# Altium integrated library Supp-Lib.IntLib: 86 symbols
Pins are listed as number, name and electrical type; pins without a type are passive.

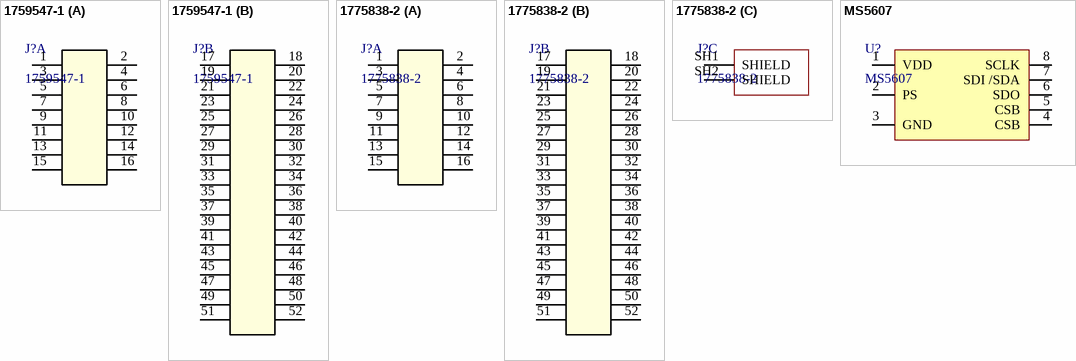
[diagram p0: symbols 1759547-1 to MS5607]

## 1759547-1
designator J?
Mini PCI Express, Mini PCI Express & mSATA, Board-to-Board, 52 Position, .031 in [.8 mm] Centerline, Stack Height 7 mm [.276 in], Gold Flash, Matte; Mfr_Name: TE Connectivity; Copyright: Copyright (C) 2022 Ultra Librarian. All rights reserved.; Manufacturer_Part_Number: 1759547-1; RefDes: RefDes; Type: DEV; ComponentLink1Description: Darasheet; ComponentLink1URL: https://www.te.com.cn/commerce/DocumentDelivery/DDEController?Action=showdoc&DocId=Customer+Drawing%7F1759547%7FJ%7Fpdf%7FEnglish%7FENG_CD_1759547_J.pdf%7F1759547-1; Supplier 1: Arrow Electronics; Supplier Part Number 1: 1759547-1
footprint CONN52_1759547-1_TEC
part A pins: 1, 2, 3, 4, 5, 6, 7, 8, 9, 10, 11, 12, 13, 14, 15, 16
part B pins: 17, 18, 19, 20, 21, 22, 23, 24, 25, 26, 27, 28, 29, 30, 31, 32, 33, 34, 35, 36, 37, 38, 39, 40, 41, 42, 43, 44, 45, 46, 47, 48, 49, 50, 51, 52

## 1775838-2
designator J?
Conn Mini PCI Express Card Edge SKT 52 POS Solder RA SMD T/R; Product_Type: Connector; Centerline_Pitch: .8 mm[.031 in]; MF: TE Connectivity; Number_of_Positions: 52; Availability: Unavailable; MP: 1775838-2; Value: *; Package: None; SnapEDA_Link: https://www.snapeda.com/parts/1775838-2/TE%20Connectivity%20AMP%20Connectors/view-part/804031/?ref=snap; TE_purchase_URL: https://www.te.com/usa-en/product-1775838-2.html?te_bu=Cor&te_type=disp&te_campaign=seda_glo_cor-seda-global-disp-prtnr-fy19-seda-model-bom-cta_sma-317_1&elqCampaignId=32493; EU_RoHS_Compliance: Compliant; Price: None
footprint 17758382
part A pins: 1, 2, 3, 4, 5, 6, 7, 8, 9, 10, 11, 12, 13, 14, 15, 16
part B pins: 17, 18, 19, 20, 21, 22, 23, 24, 25, 26, 27, 28, 29, 30, 31, 32, 33, 34, 35, 36, 37, 38, 39, 40, 41, 42, 43, 44, 45, 46, 47, 48, 49, 50, 51, 52
part C pins: SH1 SHIELD, SH2 SHIELD

## MS5607
designator U?
Barometric Pressure Sensor, with stainless steel cap; ComponentLink1Description: Darasheet; ComponentLink1URL: https://www.te.com.cn/commerce/DocumentDelivery/DDEController?Action=showdoc&DocId=Data+Sheet%7FMS5607-02BA03%7FB3%7Fpdf%7FEnglish%7FENG_DS_MS5607-02BA03_B3.pdf%7FMS560702BA03-50
footprint MS5607
pins: 1 VDD, 2 PS, 3 GND, 4 CSB, 5 CSB, 6 SDO, 7 SDI /SDA, 8 SCLK


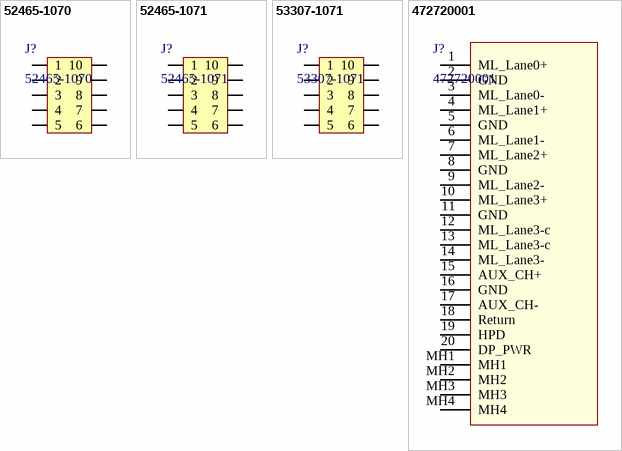
[diagram p1: symbols 52465-1070 to 472720001]

## 52465-1070
designator J?
SlimStack板对板连接器， / 0.80毫米端子间距，浮动接点系列
footprint 52465-1070
pins: 1, 2, 3, 4, 5, 6, 7, 8, 9, 10

## 52465-1071
designator J?
SlimStack板对板连接器， / 0.80毫米端子间距，浮动接点系列
footprint 52465-1071
pins: 1, 2, 3, 4, 5, 6, 7, 8, 9, 10

## 53307-1071
designator J?
SlimStack板对板连接器， / 0.80毫米端子间距，浮动接点系列
footprint 53307-1071
pins: 1, 2, 3, 4, 5, 6, 7, 8, 9, 10

## 472720001
designator J?
Connector; Manufacturer_Name: Molex; Datasheet Link: https://www.arrow.com/en/products/472720001/molex; Height: 6.9mm; Manufacturer_Part_Number: 472720001; Arrow Part Number: 472720001; Arrow Price/Stock: https://www.arrow.com/en/products/472720001/molex
footprint 472720001
pins: 1 ML_Lane0+, 2 GND, 3 ML_Lane0-, 4 ML_Lane1+, 5 GND, 6 ML_Lane1-, 7 ML_Lane2+, 8 GND, 9 ML_Lane2-, 10 ML_Lane3+, 11 GND, 12 ML_Lane3-c, 13 ML_Lane3-c, 14 ML_Lane3-, 15 AUX_CH+, 16 GND, 17 AUX_CH-, 18 Return, 19 HPD, 20 DP_PWR, MH1, MH2, MH3, MH4


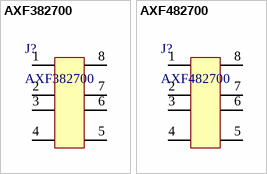
[diagram p2: symbols AXF382700 to AXF482700]

## AXF382700
designator J?
松下连接器 0.7高度8PIN 5A/0.3A
footprint AXF382700
pins: 1, 2, 3, 4, 5, 6, 7, 8

## AXF482700
designator J?
松下连接器 0.7高度8PIN 5A/0.3A
footprint AXF482700
pins: 1, 2, 3, 4, 5, 6, 7, 8


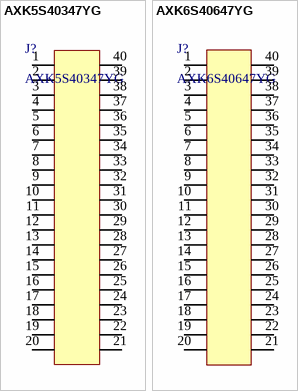
[diagram p3: symbols AXK5S40347YG to AXK6S40647YG]

## AXK5S40347YG
designator J?
P5KS(0.5mm间距)板对板连接器  组合高度（7.0/8.0/9.0）
footprint AXK5S40347YG
pins: 1, 2, 3, 4, 5, 6, 7, 8, 9, 10, 11, 12, 13, 14, 15, 16, 17, 18, 19, 20, 21, 22, 23, 24, 25, 26, 27, 28, 29, 30, 31, 32, 33, 34, 35, 36, 37, 38, 39, 40

## AXK6S40647YG
designator J?
P5KS(0.5mm间距)板对板连接器  组合高度（6.0/6.5/9.0）
footprint AXK6S40647YG
pins: 1, 2, 3, 4, 5, 6, 7, 8, 9, 10, 11, 12, 13, 14, 15, 16, 17, 18, 19, 20, 21, 22, 23, 24, 25, 26, 27, 28, 29, 30, 31, 32, 33, 34, 35, 36, 37, 38, 39, 40


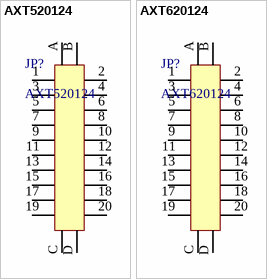
[diagram p4: symbols AXT520124 to AXT620124]

## AXT520124
designator JP?
窄间距连接器F4S(0.4mm间距)母座
footprint AXT520124 (20-PIN 插座)
pins: 1, 2, 3, 4, 5, 6, 7, 8, 9, 10, 11, 12, 13, 14, 15, 16, 17, 18, 19, 20, A, B, C, D

## AXT620124
designator JP?
窄间距连接器F4S(0.4mm间距)公头
footprint AXT620124 (20-PIN 插座)
pins: 1, 2, 3, 4, 5, 6, 7, 8, 9, 10, 11, 12, 13, 14, 15, 16, 17, 18, 19, 20, A, B, C, D


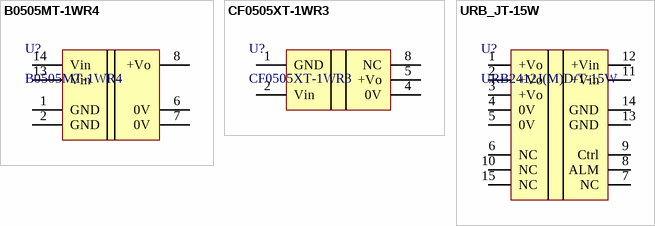
[diagram p5: symbols B0505MT-1WR4 to URB_JT-15W]

## B0505MT-1WR4
designator U?
1W，定电压输入，隔离非稳压单路输出; Revised By: *; ComponentLink1Description: Datasheet; ComponentLink1URL: https://www.mornsun.cn/html/pdf/B0505MT-1WR4.html
footprint B-MT-1WR4
pins: 1 GND, 2 GND, 6 0V, 7 0V, 8 +Vo, 13 Vin, 14 Vin

## CF0505XT-1WR3
designator U?
1W，定电压输入，隔离非稳压单路输出; Revised By: Z_xiao; ComponentLink1Description: Datasheet; ComponentLink1URL: https://www.mornsun.cn/html/pdf/CF0505XT-1WR3.html
footprint F0505XT-W2R3
pins: 1 GND, 2 Vin, 4 0V, 5 +Vo, 8 NC

## URB_JT-15W
designator U?, comment URB2412J(M)D/T-15W
15W，超宽电压输入，隔离稳压单路输出 / DIP/SMD 封装，DC-DC 模块电源
footprint URB_JT-15W
footprint URB_JT-15W - bottom
pins: 1 +Vo, 2 +Vo, 3 +Vo, 4 0V, 5 0V (oe), 6 NC (oe), 7 NC (oe), 8 ALM, 9 Ctrl (oe), 10 NC (oe), 11 +Vin, 12 +Vin, 13 GND, 14 GND, 15 NC (oe)


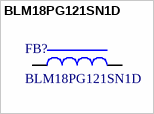
[diagram p6: symbol BLM18PG121SN1D]

## BLM18PG121SN1D
designator FB?
EMIFIL (Inductor type) Chip Ferrite Bead / BLM18P Series (0603 Size); Mfr_Name: Murata; Type: DEV; Impedance: 120ohm@100MHz; Rated Current: 2A; Copyright: Copyright (C) 2022 Ultra Librarian. All rights reserved.; Manufacturer_Part_Number: BLM18PG121SN1D; RefDes: RefDes
footprint IND_BLM18_0603_MUR
footprint IND_BLM18_0603_MUR-L
footprint IND_BLM18_0603_MUR-M
pins: 1, 2


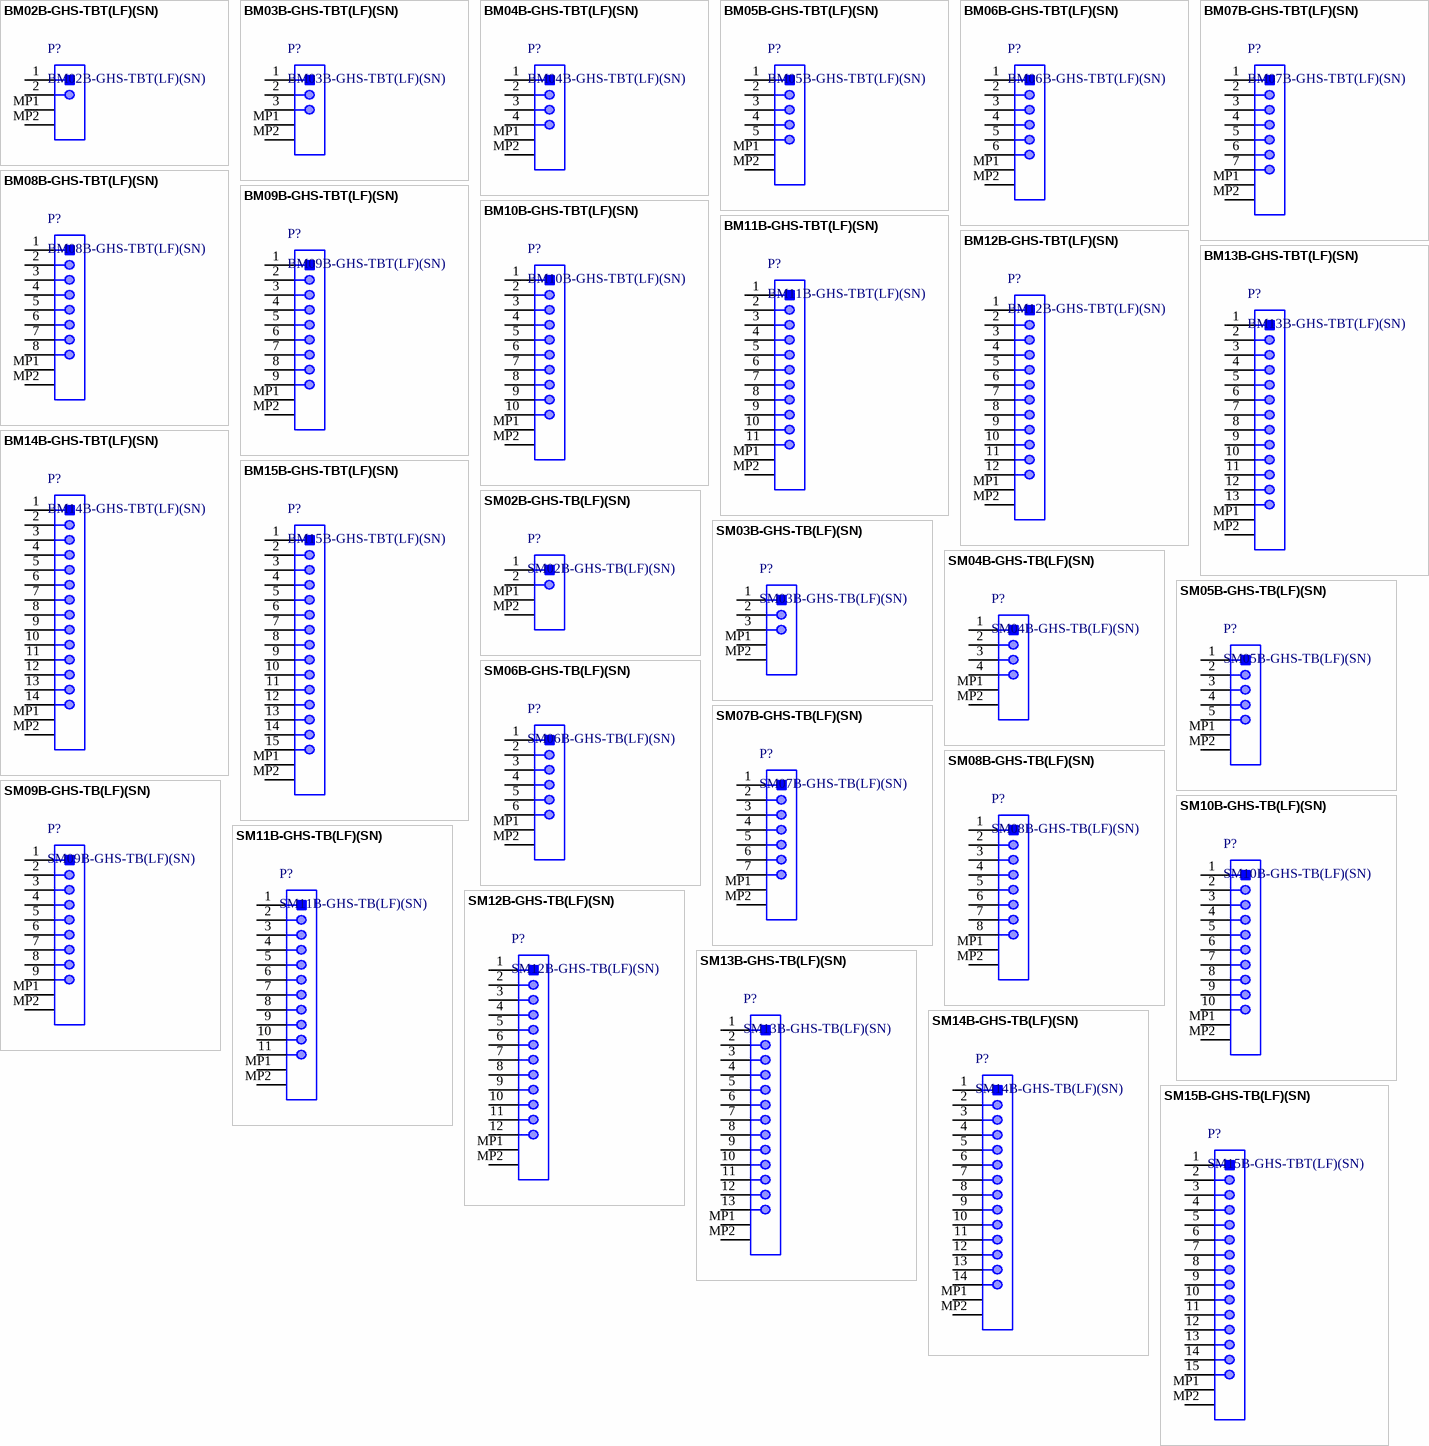
[diagram p7: symbols BM02B-GHS-TBT(LF)(SN) to SM15B-GHS-TB(LF)(SN)]

## BM02B-GHS-TBT(LF)(SN)
designator P?
GH Disconnectable Crimp Style Connector, Pitch 1.25 mm, 1 x 2 Position, Height 4.05 mm, -25 to 85 degC, RoHS, Tape and Reel; Manufacturer: JST; No of Positions: 2; Pitch: 1.25mm; Style/Orientation: StraightHeader/Plug; Package Reference: BM02B-GHS-TBT; Type: WiretoBoard; Datasheet URL: http://www.jst-mfg.com/product/pdf/eng/eGH.pdf; Termination: Crimp; Manufacturer URL: http://www.jst.com/home2.html; Mounting Technology: SurfaceMount; Datasheet Version: 05/2016; Package Description: GH Disconnectable Crimp Style Connector, Pitch 1.25 mm, 1 x 2 Position, Height 4.05 mm
footprint JST-BM02B-GHS-TBT_V (Connector, 2-Leads, Body 5.75x4.25mm, Pitch 1.25mm)
pins: 1, 2, MP1, MP2

## BM03B-GHS-TBT(LF)(SN)
designator P?
GH Disconnectable Crimp Style Connector, Pitch 1.25 mm, 1 x 3 Position, Height 4.05 mm, -25 to 85 degC, RoHS, Tape and Reel; Manufacturer: JST; No of Positions: 3; Pitch: 1.25mm; Style/Orientation: StraightHeader/Plug; Package Reference: BM03B-GHS-TBT; Type: WiretoBoard; Datasheet URL: http://www.jst-mfg.com/product/pdf/eng/eGH.pdf; Termination: Crimp; Manufacturer URL: http://www.jst.com/home2.html; Mounting Technology: SurfaceMount; Datasheet Version: 05/2016; Package Description: GH Disconnectable Crimp Style Connector, Pitch 1.25 mm, 1 x 3 Position, Height 4.05 mm
footprint JST-BM03B-GHS-TBT_V (Connector, 3-Leads, Body 7.00x4.25mm, Pitch 1.25mm)
pins: 1, 2, 3, MP1, MP2

## BM04B-GHS-TBT(LF)(SN)
designator P?
GH Disconnectable Crimp Style Connector, Pitch 1.25 mm, 1 x 4 Position, Height 4.05 mm, -25 to 85 degC, RoHS, Tape and Reel; Manufacturer: JST; No of Positions: 4; Pitch: 1.25mm; Style/Orientation: StraightHeader/Plug; Package Reference: BM04B-GHS-TBT; Type: WiretoBoard; Datasheet URL: http://www.jst-mfg.com/product/pdf/eng/eGH.pdf; Termination: Crimp; Manufacturer URL: http://www.jst.com/home2.html; Mounting Technology: SurfaceMount; Datasheet Version: 05/2016; Package Description: GH Disconnectable Crimp Style Connector, Pitch 1.25 mm, 1 x 4 Position, Height 4.05 mm
footprint JST-BM04B-GHS-TBT_V (Connector, 4-Leads, Body 8.25x4.25mm, Pitch 1.25mm)
pins: 1, 2, 3, 4, MP1, MP2

## BM05B-GHS-TBT(LF)(SN)
designator P?
GH Disconnectable Crimp Style Connector, Pitch 1.25 mm, 1 x 5 Position, Height 4.05 mm, -25 to 85 degC, RoHS, Tape and Reel; Manufacturer: JST; No of Positions: 5; Pitch: 1.25mm; Style/Orientation: StraightHeader/Plug; Package Reference: BM05B-GHS-TBT; Type: WiretoBoard; Datasheet URL: http://www.jst-mfg.com/product/pdf/eng/eGH.pdf; Termination: Crimp; Manufacturer URL: http://www.jst.com/home2.html; Mounting Technology: SurfaceMount; Datasheet Version: 05/2016; Package Description: GH Disconnectable Crimp Style Connector, Pitch 1.25 mm, 1 x 5 Position, Height 4.05 mm
footprint JST-BM05B-GHS-TBT_V (Connector, 5-Leads, Body 9.5x4.25mm, Pitch 1.25mm)
pins: 1, 2, 3, 4, 5, MP1, MP2

## BM06B-GHS-TBT(LF)(SN)
designator P?
GH Disconnectable Crimp Style Connector, Pitch 1.25 mm, 1 x 6 Position, Height 4.05 mm, -25 to 85 degC, RoHS, Tape and Reel; Manufacturer: JST; No of Positions: 6; Pitch: 1.25mm; Style/Orientation: StraightHeader/Plug; Package Reference: BM06B-GHS-TBT; Type: WiretoBoard; Datasheet URL: http://www.jst-mfg.com/product/pdf/eng/eGH.pdf; Termination: Crimp; Manufacturer URL: http://www.jst.com/home2.html; Mounting Technology: SurfaceMount; Datasheet Version: 05/2016; Package Description: GH Disconnectable Crimp Style Connector, Pitch 1.25 mm, 1 x 6 Position, Height 4.05 mm
footprint JST-BM06B-GHS-TBT_V (Connector, 6-Leads, Body 10.75x4.25mm, Pitch 1.25mm)
pins: 1, 2, 3, 4, 5, 6, MP1, MP2

## BM07B-GHS-TBT(LF)(SN)
designator P?
GH Disconnectable Crimp Style Connector, Pitch 1.25 mm, 1 x 7 Position, Height 4.05 mm, -25 to 85 degC, RoHS, Tape and Reel; Manufacturer: JST; No of Positions: 7; Pitch: 1.25mm; Style/Orientation: StraightHeader/Plug; Package Reference: BM07B-GHS-TBT; Type: WiretoBoard; Datasheet URL: http://www.jst-mfg.com/product/pdf/eng/eGH.pdf; Termination: Crimp; Manufacturer URL: http://www.jst.com/home2.html; Mounting Technology: SurfaceMount; Datasheet Version: 05/2016; Package Description: GH Disconnectable Crimp Style Connector, Pitch 1.25 mm, 1 x 7 Position, Height 4.05 mm
footprint JST-BM07B-GHS-TBT_V (Connector, 7-Leads, Body 12.00x4.25mm, Pitch 1.25mm)
pins: 1, 2, 3, 4, 5, 6, 7, MP1, MP2

## BM08B-GHS-TBT(LF)(SN)
designator P?
GH Disconnectable Crimp Style Connector, Pitch 1.25 mm, 1 x 8 Position, Height 4.05 mm, -25 to 85 degC, RoHS, Tape and Reel; Manufacturer: JST; No of Positions: 8; Pitch: 1.25mm; Style/Orientation: StraightHeader/Plug; Package Reference: BM08B-GHS-TBT; Type: WiretoBoard; Datasheet URL: http://www.jst-mfg.com/product/pdf/eng/eGH.pdf; Termination: Crimp; Manufacturer URL: http://www.jst.com/home2.html; Mounting Technology: SurfaceMount; Datasheet Version: 05/2016; Package Description: GH Disconnectable Crimp Style Connector, Pitch 1.25 mm, 1 x 8 Position, Height 4.05 mm
footprint JST-BM08B-GHS-TBT_V (Connector, 8-Leads, Body 13.25x4.25mm, Pitch 1.25mm)
pins: 1, 2, 3, 4, 5, 6, 7, 8, MP1, MP2

## BM09B-GHS-TBT(LF)(SN)
designator P?
GH Disconnectable Crimp Style Connector, Pitch 1.25 mm, 1 x 9 Position, Height 4.05 mm, -25 to 85 degC, RoHS, Tape and Reel; Manufacturer: JST; No of Positions: 9; Pitch: 1.25mm; Style/Orientation: StraightHeader/Plug; Package Reference: BM09B-GHS-TBT; Type: WiretoBoard; Datasheet URL: http://www.jst-mfg.com/product/pdf/eng/eGH.pdf; Termination: Crimp; Manufacturer URL: http://www.jst.com/home2.html; Mounting Technology: SurfaceMount; Datasheet Version: 05/2016; Package Description: GH Disconnectable Crimp Style Connector, Pitch 1.25 mm, 1 x 9 Position, Height 4.05 mm
footprint JST-BM09B-GHS-TBT_V (Connector, 9-Leads, Body  14.50x4.25mm, Pitch 1.25mm)
pins: 1, 2, 3, 4, 5, 6, 7, 8, 9, MP1, MP2

## BM10B-GHS-TBT(LF)(SN)
designator P?
GH Disconnectable Crimp Style Connector, Pitch 1.25 mm, 1 x 10 Position, Height 4.05 mm, -25 to 85 degC, RoHS, Tape and Reel; Manufacturer: JST; No of Positions: 10; Pitch: 1.25mm; Style/Orientation: StraightHeader/Plug; Package Reference: BM10B-GHS-TBT; Type: WiretoBoard; Datasheet URL: http://www.jst-mfg.com/product/pdf/eng/eGH.pdf; Termination: Crimp; Manufacturer URL: http://www.jst.com/home2.html; Mounting Technology: SurfaceMount; Datasheet Version: 05/2016; Package Description: GH Disconnectable Crimp Style Connector, Pitch 1.25 mm, 1 x 10 Position, Height 4.05 mm
footprint JST-BM10B-GHS-TBT_V (Connector, 10-Leads, Body  15.75x4.25mm, Pitch 1.25mm)
pins: 1, 2, 3, 4, 5, 6, 7, 8, 9, 10, MP1, MP2

## BM11B-GHS-TBT(LF)(SN)
designator P?
GH Disconnectable Crimp Style Connector, Pitch 1.25 mm, 1 x 11 Position, Height 4.05 mm, -25 to 85 degC, RoHS, Tape and Reel; Manufacturer: JST; No of Positions: 11; Pitch: 1.25mm; Style/Orientation: StraightHeader/Plug; Package Reference: BM11B-GHS-TBT; Type: WiretoBoard; Datasheet URL: http://www.jst-mfg.com/product/pdf/eng/eGH.pdf; Termination: Crimp; Manufacturer URL: http://www.jst.com/home2.html; Mounting Technology: SurfaceMount; Datasheet Version: 05/2016; Package Description: GH Disconnectable Crimp Style Connector, Pitch 1.25 mm, 1 x 11 Position, Height 4.05 mm
footprint JST-BM11B-GHS-TBT_V (Connector, 11-Leads, Body  17.00x4.25mm, Pitch 1.25mm)
pins: 1, 2, 3, 4, 5, 6, 7, 8, 9, 10, 11, MP1, MP2

## BM12B-GHS-TBT(LF)(SN)
designator P?
GH Disconnectable Crimp Style Connector, Pitch 1.25 mm, 1 x 12 Position, Height 4.05 mm, -25 to 85 degC, RoHS, Tape and Reel; Manufacturer: JST; No of Positions: 12; Pitch: 1.25mm; Style/Orientation: StraightHeader/Plug; Package Reference: BM12B-GHS-TBT; Type: WiretoBoard; Datasheet URL: http://www.jst-mfg.com/product/pdf/eng/eGH.pdf; Termination: Crimp; Manufacturer URL: http://www.jst.com/home2.html; Mounting Technology: SurfaceMount; Datasheet Version: 05/2016; Package Description: GH Disconnectable Crimp Style Connector, Pitch 1.25 mm, 1 x 12 Position, Height 4.05 mm
footprint JST-BM12B-GHS-TBT_V (Connector, 12-Leads, Body  18.25x4.25mm, Pitch 1.25mm)
pins: 1, 2, 3, 4, 5, 6, 7, 8, 9, 10, 11, 12, MP1, MP2

## BM13B-GHS-TBT(LF)(SN)
designator P?
GH Disconnectable Crimp Style Connector, Pitch 1.25 mm, 1 x 13 Position, Height 4.05 mm, -25 to 85 degC, RoHS, Tape and Reel; Manufacturer: JST; No of Positions: 13; Pitch: 1.25mm; Style/Orientation: StraightHeader/Plug; Package Reference: BM13B-GHS-TBT; Type: WiretoBoard; Datasheet URL: http://www.jst-mfg.com/product/pdf/eng/eGH.pdf; Termination: Crimp; Manufacturer URL: http://www.jst.com/home2.html; Mounting Technology: SurfaceMount; Datasheet Version: 05/2016; Package Description: GH Disconnectable Crimp Style Connector, Pitch 1.25 mm, 1 x 13 Position, Height 4.05 mm
footprint JST-BM13B-GHS-TBT_V (Connector, 13-Leads, Body  19.50x4.25mm, Pitch 1.25mm)
pins: 1, 2, 3, 4, 5, 6, 7, 8, 9, 10, 11, 12, 13, MP1, MP2

## BM14B-GHS-TBT(LF)(SN)
designator P?
GH Disconnectable Crimp Style Connector, Pitch 1.25 mm, 1 x 14 Position, Height 4.05 mm, -25 to 85 degC, RoHS, Tape and Reel; Manufacturer: JST; No of Positions: 14; Pitch: 1.25mm; Style/Orientation: StraightHeader/Plug; Package Reference: BM14B-GHS-TBT; Type: WiretoBoard; Datasheet URL: http://www.jst-mfg.com/product/pdf/eng/eGH.pdf; Termination: Crimp; Manufacturer URL: http://www.jst.com/home2.html; Mounting Technology: SurfaceMount; Datasheet Version: 05/2016; Package Description: GH Disconnectable Crimp Style Connector, Pitch 1.25 mm, 1 x 14 Position, Height 4.05 mm
footprint JST-BM14B-GHS-TBT_V (Connector, 14-Leads, Body  20.75x4.25mm, Pitch 1.25mm)
pins: 1, 2, 3, 4, 5, 6, 7, 8, 9, 10, 11, 12, 13, 14, MP1, MP2

## BM15B-GHS-TBT(LF)(SN)
designator P?
GH Disconnectable Crimp Style Connector, Pitch 1.25 mm, 1 x 15 Position, Height 4.05 mm, -25 to 85 degC, RoHS, Tape and Reel; Manufacturer: JST; No of Positions: 15; Pitch: 1.25mm; Style/Orientation: StraightHeader/Plug; Package Reference: BM15B-GHS-TBT; Type: WiretoBoard; Datasheet URL: http://www.jst-mfg.com/product/pdf/eng/eGH.pdf; Termination: Crimp; Manufacturer URL: http://www.jst.com/home2.html; Mounting Technology: SurfaceMount; Datasheet Version: 05/2016; Package Description: GH Disconnectable Crimp Style Connector, Pitch 1.25 mm, 1 x 15 Position, Height 4.05 mm
footprint JST-BM15B-GHS-TBT_V (Connector, 15-Leads, Body  22.00x4.25mm, Pitch 1.25mm)
pins: 1, 2, 3, 4, 5, 6, 7, 8, 9, 10, 11, 12, 13, 14, 15, MP1, MP2

## SM02B-GHS-TB(LF)(SN)
designator P?
GH Disconnectable Crimp Style Connector, Pitch 1.25 mm, 1 x 2 Position, Height 4.25 mm, -25 to 85 degC, RoHS, Tape and Reel; Manufacturer: JST; No of Positions: 2; Pitch: 1.25mm; Style/Orientation: RightAngleHeader/Plug; Package Reference: SM02B-GHS-TB; Type: WiretoBoard; Datasheet URL: http://www.jst-mfg.com/product/pdf/eng/eGH.pdf; Termination: Crimp; Manufacturer URL: http://www.jst.com/home2.html; Mounting Technology: SurfaceMount; Datasheet Version: 05/2016; Package Description: GH Disconnectable Crimp Style Connector, Pitch 1.25 mm, 1 x 2 Position, Height 4.25 mm
footprint JST-SM02B-GHS-TB_V (SMD, 2-Leads, Body 5.75x4.05mm, Pitch 1.25mm)
pins: 1, 2, MP1, MP2

## SM03B-GHS-TB(LF)(SN)
designator P?
GH Disconnectable Crimp Style Connector, Pitch 1.25 mm, 1 x 3 Position, Height 4.25 mm, -25 to 85 degC, RoHS, Tape and Reel; Manufacturer: JST; No of Positions: 3; Pitch: 1.25mm; Style/Orientation: RightAngleHeader/Plug; Package Reference: SM03B-GHS-TB; Type: WiretoBoard; Datasheet URL: http://www.jst-mfg.com/product/pdf/eng/eGH.pdf; Termination: Crimp; Manufacturer URL: http://www.jst.com/home2.html; Mounting Technology: SurfaceMount; Datasheet Version: 05/2016; Package Description: GH Disconnectable Crimp Style Connector, Pitch 1.25 mm, 1 x 3 Position, Height 4.25 mm
footprint JST-SM03B-GHS-TB_V (SMD, 3-Leads, Body 7.00x4.05mm, Pitch 1.25mm)
pins: 1, 2, 3, MP1, MP2

## SM04B-GHS-TB(LF)(SN)
designator P?
GH Disconnectable Crimp Style Connector, Pitch 1.25 mm, 1 x 4 Position, Height 4.25 mm, -25 to 85 degC, RoHS, Tape and Reel; Manufacturer: JST; No of Positions: 4; Pitch: 1.25mm; Style/Orientation: RightAngleHeader/Plug; Package Reference: SM04B-GHS-TB; Type: WiretoBoard; Datasheet URL: http://www.jst-mfg.com/product/pdf/eng/eGH.pdf; Termination: Crimp; Manufacturer URL: http://www.jst.com/home2.html; Mounting Technology: SurfaceMount; Datasheet Version: 05/2016; Package Description: GH Disconnectable Crimp Style Connector, Pitch 1.25 mm, 1 x 4 Position, Height 4.25 mm
footprint JST-SM04B-GHS-TB_V (SMD, 4-Leads, Body 8.25x4.05mm, Pitch 1.25mm)
pins: 1, 2, 3, 4, MP1, MP2

## SM05B-GHS-TB(LF)(SN)
designator P?
GH Disconnectable Crimp Style Connector, Pitch 1.25 mm, 1 x 5 Position, Height 4.25 mm, -25 to 85 degC, RoHS, Tape and Reel; Manufacturer: JST; No of Positions: 5; Pitch: 1.25mm; Style/Orientation: RightAngleHeader/Plug; Package Reference: SM05B-GHS-TB; Type: WiretoBoard; Datasheet URL: http://www.jst-mfg.com/product/pdf/eng/eGH.pdf; Termination: Crimp; Manufacturer URL: http://www.jst.com/home2.html; Mounting Technology: SurfaceMount; Datasheet Version: 05/2016; Package Description: GH Disconnectable Crimp Style Connector, Pitch 1.25 mm, 1 x 5 Position, Height 4.25 mm
footprint JST-SM05B-GHS-TB_V (SMD, 5-Leads, Body 9.50x4.05mm, Pitch 1.25mm)
pins: 1, 2, 3, 4, 5, MP1, MP2

## SM06B-GHS-TB(LF)(SN)
designator P?
GH Disconnectable Crimp Style Connector, Pitch 1.25 mm, 1 x 6 Position, Height 4.25 mm, -25 to 85 degC, RoHS, Tape and Reel; Manufacturer: JST; No of Positions: 6; Pitch: 1.25mm; Style/Orientation: RightAngleHeader/Plug; Package Reference: SM06B-GHS-TB; Type: WiretoBoard; Datasheet URL: http://www.jst-mfg.com/product/pdf/eng/eGH.pdf; Termination: Crimp; Manufacturer URL: http://www.jst.com/home2.html; Mounting Technology: SurfaceMount; Datasheet Version: 05/2016; Package Description: GH Disconnectable Crimp Style Connector, Pitch 1.25 mm, 1 x 6 Position, Height 4.25 mm
footprint JST-SM06B-GHS-TB_V (SMD, 6-Leads, Body 10.75x4.05mm, Pitch 1.25mm)
pins: 1, 2, 3, 4, 5, 6, MP1, MP2

## SM07B-GHS-TB(LF)(SN)
designator P?
GH Disconnectable Crimp Style Connector, Pitch 1.25 mm, 1 x 7 Position, Height 4.25 mm, -25 to 85 degC, RoHS, Tape and Reel; Manufacturer: JST; No of Positions: 7; Pitch: 1.25mm; Style/Orientation: RightAngleHeader/Plug; Package Reference: SM07B-GHS-TB; Type: WiretoBoard; Datasheet URL: http://www.jst-mfg.com/product/pdf/eng/eGH.pdf; Termination: Crimp; Manufacturer URL: http://www.jst.com/home2.html; Mounting Technology: SurfaceMount; Datasheet Version: 05/2016; Package Description: GH Disconnectable Crimp Style Connector, Pitch 1.25 mm, 1 x 7 Position, Height 4.25 mm
footprint JST-BM07B-GHS-TBT_V (Connector, 7-Leads, Body 12.00x4.25mm, Pitch 1.25mm)
pins: 1, 2, 3, 4, 5, 6, 7, MP1, MP2

## SM08B-GHS-TB(LF)(SN)
designator P?
GH Disconnectable Crimp Style Connector, Pitch 1.25 mm, 1 x 8 Position, Height 4.25 mm, -25 to 85 degC, RoHS, Tape and Reel; Manufacturer: JST; No of Positions: 8; Pitch: 1.25mm; Style/Orientation: RightAngleHeader/Plug; Package Reference: SM08B-GHS-TB; Type: WiretoBoard; Datasheet URL: http://www.jst-mfg.com/product/pdf/eng/eGH.pdf; Termination: Crimp; Manufacturer URL: http://www.jst.com/home2.html; Mounting Technology: SurfaceMount; Datasheet Version: 05/2016; Package Description: GH Disconnectable Crimp Style Connector, Pitch 1.25 mm, 1 x 8 Position, Height 4.25 mm
footprint JST-SM08B-GHS-TB_V (SMD, 8-Leads, Body 13.25x4.05mm, Pitch 1.25mm)
pins: 1, 2, 3, 4, 5, 6, 7, 8, MP1, MP2

## SM09B-GHS-TB(LF)(SN)
designator P?
GH Disconnectable Crimp Style Connector, Pitch 1.25 mm, 1 x 9 Position, Height 4.25 mm, -25 to 85 degC, RoHS, Tape and Reel; Manufacturer: JST; No of Positions: 9; Pitch: 1.25mm; Style/Orientation: RightAngleHeader/Plug; Package Reference: SM09B-GHS-TB; Type: WiretoBoard; Datasheet URL: http://www.jst-mfg.com/product/pdf/eng/eGH.pdf; Termination: Crimp; Manufacturer URL: http://www.jst.com/home2.html; Mounting Technology: SurfaceMount; Datasheet Version: 05/2016; Package Description: GH Disconnectable Crimp Style Connector, Pitch 1.25 mm, 1 x 9 Position, Height 4.25 mm
footprint JST-SM09B-GHS-TB_V (SMD, 9-Leads, Body 14.50x4.05mm, Pitch 1.25mm)
pins: 1, 2, 3, 4, 5, 6, 7, 8, 9, MP1, MP2

## SM10B-GHS-TB(LF)(SN)
designator P?